# Altium footprint library micro-intel.PCBLIB: 48 footprints (part 1 of 4)
Each footprint in its own frame and in the unit in brackets; x right, y up, seen from the top. Pads: shape width x height; smd on the part's side, far side on the other; paste and mask are expansions set on the pad; w line width, h text height; cw(c..) or ccw(c..) is an arc to the next point about the centre after c.
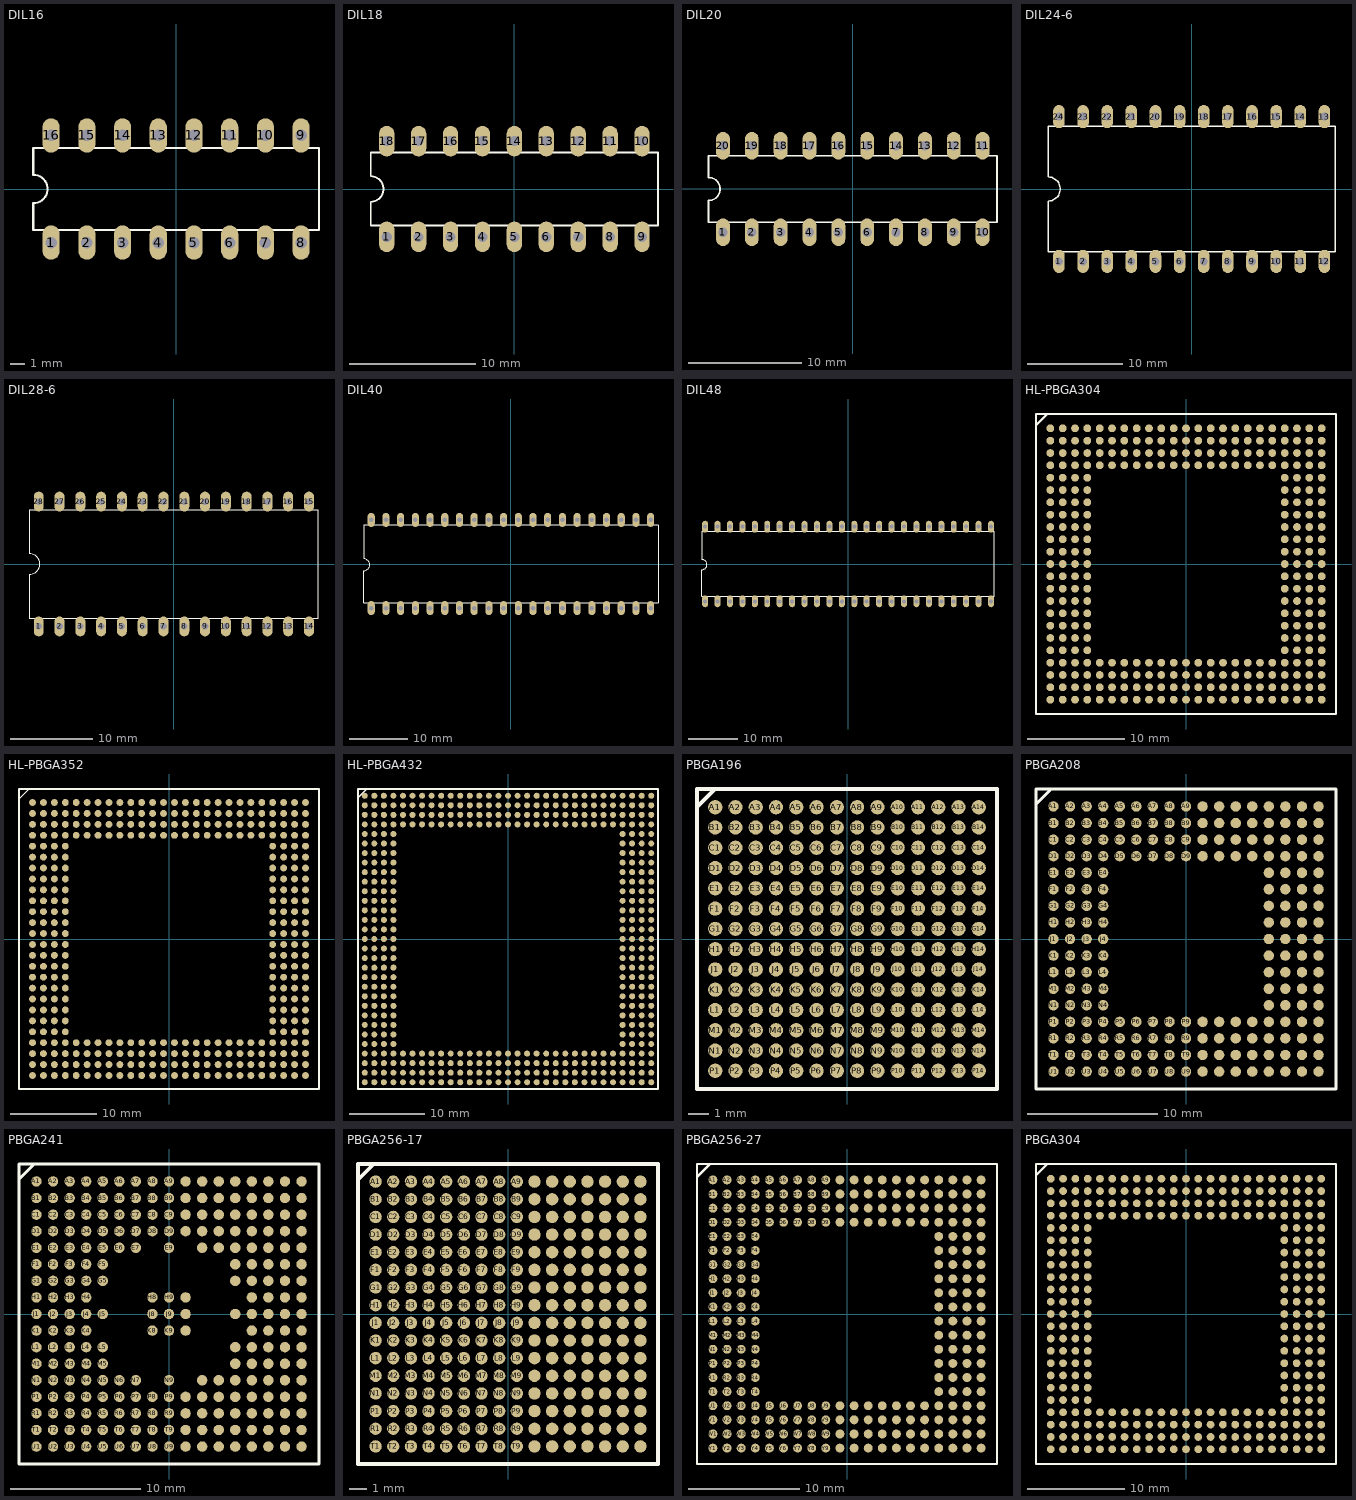
[diagram p0: the footprints below, top view; thin cyan lines are the x and y axes]

## DIL16 [mil]
pads (16):
  oval 48x96 hole 32: 1(-350,-150) 2(-250,-150) 3(-150,-150) 4(-50,-150) 5(50,-150) 6(150,-150) 7(250,-150) 8(350,-150) 9(350,150) 10(250,150) 11(150,150) 12(50,150) 13(-50,150) 14(-150,150) 15(-250,150) 16(-350,150)
Top Overlay:
  lines w6: -400,-115 400,-115 400,115 -400,115 -400,40 cw(c-400,0) -400,-40 -400,-115

## DIL18 [mil]
pads (18):
  oval 48x96 hole 32: 1(-400,-150) 2(-300,-150) 3(-200,-150) 4(-100,-150) 5(0,-150) 6(100,-150) 7(200,-150) 8(300,-150) 9(400,-150) 10(400,150) 11(300,150) 12(200,150) 13(100,150) 14(0,150) 15(-100,150) 16(-200,150) 17(-300,150) 18(-400,150)
Top Overlay:
  lines w6: -450,-115 450,-115 450,115 -450,115 -450,40 cw(c-450,0) -450,-40 -450,-115

## DIL20 [mil]
pads (20):
  oval 48x96 hole 32: 1(-450,-150) 2(-350,-150) 3(-250,-150) 4(-150,-150) 5(-50,-150) 6(50,-150) 7(150,-150) 8(250,-150) 9(350,-150) 10(450,-150) 11(450,150) 12(350,150) 13(250,150) 14(150,150) 15(50,150) 16(-50,150) 17(-150,150) 18(-250,150) 19(-350,150) 20(-450,150)
Top Overlay:
  lines w6: -500,-115 500,-115 500,115 -500,115 -500,40 cw(c-500,0) -500,-40 -500,-115

## DIL24-6 [mil]
pads (24):
  oval 48x96 hole 32: 1(-550,-300) 2(-450,-300) 3(-350,-300) 4(-250,-300) 5(-150,-300) 6(-50,-300) 7(50,-300) 8(150,-300) 9(250,-300) 10(350,-300) 11(450,-300) 12(550,-300) 13(550,300) 14(450,300) 15(350,300) 16(250,300) 17(150,300) 18(50,300) 19(-50,300) 20(-150,300) 21(-250,300) 22(-350,300) 23(-450,300) 24(-550,300)
Top Overlay:
  lines w6: -595,-260 -595,-50 ccw(c-595,0) -595,50 -595,260 595,260 595,-260 -595,-260

## DIL28-6 [mil]
pads (28):
  oval 48x96 hole 32: 1(-650,-300) 2(-550,-300) 3(-450,-300) 4(-350,-300) 5(-250,-300) 6(-150,-300) 7(-50,-300) 8(50,-300) 9(150,-300) 10(250,-300) 11(350,-300) 12(450,-300) 13(550,-300) 14(650,-300) 15(650,300) 16(550,300) 17(450,300) 18(350,300) 19(250,300) 20(150,300) 21(50,300) 22(-50,300) 23(-150,300) 24(-250,300) 25(-350,300) 26(-450,300) 27(-550,300) 28(-650,300)
Top Overlay:
  lines w6: -695,-260 -695,-50 ccw(c-695,0) -695,50 -695,260 695,260 695,-260 -695,-260

## DIL40 [mil]
pads (40):
  oval 48x96 hole 32: 1(-950,-300) 2(-850,-300) 3(-750,-300) 4(-650,-300) 5(-550,-300) 6(-450,-300) 7(-350,-300) 8(-250,-300) 9(-150,-300) 10(-50,-300) 11(50,-300) 12(150,-300) 13(250,-300) 14(350,-300) 15(450,-300) 16(550,-300) 17(650,-300) 18(750,-300) 19(850,-300) 20(950,-300) 21(950,300) 22(850,300) 23(750,300) 24(650,300) 25(550,300) 26(450,300) 27(350,300) 28(250,300) 29(150,300) 30(50,300) 31(-50,300) 32(-150,300) 33(-250,300) 34(-350,300) 35(-450,300) 36(-550,300) 37(-650,300) 38(-750,300) 39(-850,300) 40(-950,300)
Top Overlay:
  lines w6: -1000,-265 1000,-265 1000,265 -1000,265 -1000,35 cw(c-1000,-5) -1000,-45 -1000,-265

## DIL48 [mil]
pads (48):
  oval 48x96 hole 32: 1(-1150,-300) 2(-1050,-300) 3(-950,-300) 4(-850,-300) 5(-750,-300) 6(-650,-300) 7(-550,-300) 8(-450,-300) 9(-350,-300) 10(-250,-300) 11(-150,-300) 12(-50,-300) 13(50,-300) 14(150,-300) 15(250,-300) 16(350,-300) 17(450,-300) 18(550,-300) 19(650,-300) 20(750,-300) 21(850,-300) 22(950,-300) 23(1050,-300) 24(1150,-300) 25(1150,300) 26(1050,300) 27(950,300) 28(850,300) 29(750,300) 30(650,300) 31(550,300) 32(450,300) 33(350,300) 34(250,300) 35(150,300) 36(50,300) 37(-50,300) 38(-150,300) 39(-250,300) 40(-350,300) 41(-450,300) 42(-550,300) 43(-650,300) 44(-750,300) 45(-850,300) 46(-950,300) 47(-1050,300) 48(-1150,300)
Top Overlay:
  lines w6: -1175,-260 1175,-260 1175,260 -1175,260 -1175,35 cw(c-1175,-5) -1175,-45 -1175,-260

## HL-PBGA304 [mil]
pads (304):
  rrect100% 31.5x31.5 smd: A1(-550,550) A2(-500,550) A3(-450,550) A4(-400,550) A5(-350,550) A6(-300,550) A7(-250,550) A8(-200,550) A9(-150,550) A10(-100,550) A11(-50,550) A12(0,550) A13(50,550) A14(100,550) A15(150,550) A16(200,550) A17(250,550) A18(300,550) A19(350,550) A20(400,550) A21(450,550) A22(500,550) A23(550,550) AA1(-550,-450) AA2(-500,-450) AA3(-450,-450) AA4(-400,-450) AA5(-350,-450) AA6(-300,-450) AA7(-250,-450) AA8(-200,-450) AA9(-150,-450) AA10(-100,-450) AA11(-50,-450) AA12(0,-450) AA13(50,-450) AA14(100,-450) AA15(150,-450) AA16(200,-450) AA17(250,-450) AA18(300,-450) AA19(350,-450) AA20(400,-450) AA21(450,-450) AA22(500,-450) AA23(550,-450) AB1(-550,-500) AB2(-500,-500) AB3(-450,-500) AB4(-400,-500) AB5(-350,-500) AB6(-300,-500) AB7(-250,-500) AB8(-200,-500) AB9(-150,-500) AB10(-100,-500) AB11(-50,-500) AB12(0,-500) AB13(50,-500) AB14(100,-500) AB15(150,-500) AB16(200,-500) AB17(250,-500) AB18(300,-500) AB19(350,-500) AB20(400,-500) AB21(450,-500) AB22(500,-500) AB23(550,-500) AC1(-550,-550) AC2(-500,-550) AC3(-450,-550) AC4(-400,-550) AC5(-350,-550) AC6(-300,-550) AC7(-250,-550) AC8(-200,-550) AC9(-150,-550) AC10(-100,-550) AC11(-50,-550) AC12(0,-550) AC13(50,-550) AC14(100,-550) AC15(150,-550) AC16(200,-550) AC17(250,-550) AC18(300,-550) AC19(350,-550) AC20(400,-550) AC21(450,-550) AC22(500,-550) AC23(550,-550) B1(-550,500) B2(-500,500) B3(-450,500) B4(-400,500) B5(-350,500) B6(-300,500) B7(-250,500) B8(-200,500) B9(-150,500) B10(-100,500) B11(-50,500) B12(0,500) B13(50,500) B14(100,500) B15(150,500) B16(200,500) B17(250,500) B18(300,500) B19(350,500) B20(400,500) B21(450,500) B22(500,500) B23(550,500) C1(-550,450) C2(-500,450) C3(-450,450) C4(-400,450) C5(-350,450) C6(-300,450) C7(-250,450) C8(-200,450) C9(-150,450) C10(-100,450) C11(-50,450) C12(0,450) C13(50,450) C14(100,450) C15(150,450) C16(200,450) C17(250,450) C18(300,450) C19(350,450) C20(400,450) C21(450,450) C22(500,450) C23(550,450) D1(-550,400) D2(-500,400) D3(-450,400) D4(-400,400) D5(-350,400) D6(-300,400) D7(-250,400) D8(-200,400) D9(-150,400) D10(-100,400) D11(-50,400) D12(0,400) D13(50,400) D14(100,400) D15(150,400) D16(200,400) D17(250,400) D18(300,400) D19(350,400) D20(400,400) D21(450,400) D22(500,400) D23(550,400) E1(-550,350) E2(-500,350) E3(-450,350) E4(-400,350) E20(400,350) E21(450,350) E22(500,350) E23(550,350) F1(-550,300) F2(-500,300) F3(-450,300) F4(-400,300) F20(400,300) F21(450,300) F22(500,300) F23(550,300) G1(-550,250) G2(-500,250) G3(-450,250) G4(-400,250) G20(400,250) G21(450,250) G22(500,250) G23(550,250) H1(-550,200) H2(-500,200) H3(-450,200) H4(-400,200) H20(400,200) H21(450,200) H22(500,200) H23(550,200) J1(-550,150) J2(-500,150) J3(-450,150) J4(-400,150) J20(400,150) J21(450,150) J22(500,150) J23(550,150) K1(-550,100) K2(-500,100) K3(-450,100) K4(-400,100) K20(400,100) K21(450,100) K22(500,100) K23(550,100) L1(-550,50) L2(-500,50) L3(-450,50) L4(-400,50) L20(400,50) L21(450,50) L22(500,50) L23(550,50) M1(-550,0) M2(-500,0) M3(-450,0) M4(-400,0) M20(400,0) M21(450,0) M22(500,0) M23(550,0) N1(-550,-50) N2(-500,-50) N3(-450,-50) N4(-400,-50) N20(400,-50) N21(450,-50) N22(500,-50) N23(550,-50) P1(-550,-100) P2(-500,-100) P3(-450,-100) P4(-400,-100) P20(400,-100) P21(450,-100) P22(500,-100) P23(550,-100) R1(-550,-150) R2(-500,-150) R3(-450,-150) R4(-400,-150) R20(400,-150) R21(450,-150) R22(500,-150) R23(550,-150) T1(-550,-200) T2(-500,-200) T3(-450,-200) T4(-400,-200) T20(400,-200) T21(450,-200) T22(500,-200) T23(550,-200) U1(-550,-250) U2(-500,-250) U3(-450,-250) U4(-400,-250) U20(400,-250) U21(450,-250) U22(500,-250) U23(550,-250) V1(-550,-300) V2(-500,-300) V3(-450,-300) V4(-400,-300) V20(400,-300) V21(450,-300) V22(500,-300) V23(550,-300) W1(-550,-350) W2(-500,-350) W3(-450,-350) W4(-400,-350) W20(400,-350) W21(450,-350) W22(500,-350) W23(550,-350) Y1(-550,-400) Y2(-500,-400) Y3(-450,-400) Y4(-400,-400) Y5(-350,-400) Y6(-300,-400) Y7(-250,-400) Y8(-200,-400) Y9(-150,-400) Y10(-100,-400) Y11(-50,-400) Y12(0,-400) Y13(50,-400) Y14(100,-400) Y15(150,-400) Y16(200,-400) Y17(250,-400) Y18(300,-400) Y19(350,-400) Y20(400,-400) Y21(450,-400) Y22(500,-400) Y23(550,-400)
Top Overlay:
  lines w8: -608.2,562.2 -608.2,608.2 -562.2,608.2 ; -608.2,562.2 -608.2,-608.2 608.2,-608.2 608.2,608.2 -562.2,608.2 ; -608.2,562.2 -562.2,608.2
Top Solder:
  drawing of 304 lines, arcs and shapes, not listed

## HL-PBGA352 [mil]
pads (352):
  rrect100% 31.5x31.5 smd: A1(-625,625) A2(-575,625) A3(-525,625) A4(-475,625) A5(-425,625) A6(-375,625) A7(-325,625) A8(-275,625) A9(-225,625) A10(-175,625) A11(-125,625) A12(-75,625) A13(-25,625) A14(25,625) A15(75,625) A16(125,625) A17(175,625) A18(225,625) A19(275,625) A20(325,625) A21(375,625) A22(425,625) A23(475,625) A24(525,625) A25(575,625) A26(625,625) AA1(-625,-375) AA2(-575,-375) AA3(-525,-375) AA4(-475,-375) AA23(475,-375) AA24(525,-375) AA25(575,-375) AA26(625,-375) AB1(-625,-425) AB2(-575,-425) AB3(-525,-425) AB4(-475,-425) AB23(475,-425) AB24(525,-425) AB25(575,-425) AB26(625,-425) AC1(-625,-475) AC2(-575,-475) AC3(-525,-475) AC4(-475,-475) AC5(-425,-475) AC6(-375,-475) AC7(-325,-475) AC8(-275,-475) AC9(-225,-475) AC10(-175,-475) AC11(-125,-475) AC12(-75,-475) AC13(-25,-475) AC14(25,-475) AC15(75,-475) AC16(125,-475) AC17(175,-475) AC18(225,-475) AC19(275,-475) AC20(325,-475) AC21(375,-475) AC22(425,-475) AC23(475,-475) AC24(525,-475) AC25(575,-475) AC26(625,-475) AD1(-625,-525) AD2(-575,-525) AD3(-525,-525) AD4(-475,-525) AD5(-425,-525) AD6(-375,-525) AD7(-325,-525) AD8(-275,-525) AD9(-225,-525) AD10(-175,-525) AD11(-125,-525) AD12(-75,-525) AD13(-25,-525) AD14(25,-525) AD15(75,-525) AD16(125,-525) AD17(175,-525) AD18(225,-525) AD19(275,-525) AD20(325,-525) AD21(375,-525) AD22(425,-525) AD23(475,-525) AD24(525,-525) AD25(575,-525) AD26(625,-525) AE1(-625,-575) AE2(-575,-575) AE3(-525,-575) AE4(-475,-575) AE5(-425,-575) AE6(-375,-575) AE7(-325,-575) AE8(-275,-575) AE9(-225,-575) AE10(-175,-575) AE11(-125,-575) AE12(-75,-575) AE13(-25,-575) AE14(25,-575) AE15(75,-575) AE16(125,-575) AE17(175,-575) AE18(225,-575) AE19(275,-575) AE20(325,-575) AE21(375,-575) AE22(425,-575) AE23(475,-575) AE24(525,-575) AE25(575,-575) AE26(625,-575) AF1(-625,-625) AF2(-575,-625) AF3(-525,-625) AF4(-475,-625) AF5(-425,-625) AF6(-375,-625) AF7(-325,-625) AF8(-275,-625) AF9(-225,-625) AF10(-175,-625) AF11(-125,-625) AF12(-75,-625) AF13(-25,-625) AF14(25,-625) AF15(75,-625) AF16(125,-625) AF17(175,-625) AF18(225,-625) AF19(275,-625) AF20(325,-625) AF21(375,-625) AF22(425,-625) AF23(475,-625) AF24(525,-625) AF25(575,-625) AF26(625,-625) B1(-625,575) B2(-575,575) B3(-525,575) B4(-475,575) B5(-425,575) B6(-375,575) B7(-325,575) B8(-275,575) B9(-225,575) B10(-175,575) B11(-125,575) B12(-75,575) B13(-25,575) B14(25,575) B15(75,575) B16(125,575) B17(175,575) B18(225,575) B19(275,575) B20(325,575) B21(375,575) B22(425,575) B23(475,575) B24(525,575) B25(575,575) B26(625,575) C1(-625,525) C2(-575,525) C3(-525,525) C4(-475,525) C5(-425,525) C6(-375,525) C7(-325,525) C8(-275,525) C9(-225,525) C10(-175,525) C11(-125,525) C12(-75,525) C13(-25,525) C14(25,525) C15(75,525) C16(125,525) C17(175,525) C18(225,525) C19(275,525) C20(325,525) C21(375,525) C22(425,525) C23(475,525) C24(525,525) C25(575,525) C26(625,525) D1(-625,475) D2(-575,475) D3(-525,475) D4(-475,475) D5(-425,475) D6(-375,475) D7(-325,475) D8(-275,475) D9(-225,475) D10(-175,475) D11(-125,475) D12(-75,475) D13(-25,475) D14(25,475) D15(75,475) D16(125,475) D17(175,475) D18(225,475) D19(275,475) D20(325,475) D21(375,475) D22(425,475) D23(475,475) D24(525,475) D25(575,475) D26(625,475) E1(-625,425) E2(-575,425) E3(-525,425) E4(-475,425) E23(475,425) E24(525,425) E25(575,425) E26(625,425) F1(-625,375) F2(-575,375) F3(-525,375) F4(-475,375) F23(475,375) F24(525,375) F25(575,375) F26(625,375) G1(-625,325) G2(-575,325) G3(-525,325) G4(-475,325) G23(475,325) G24(525,325) G25(575,325) G26(625,325) H1(-625,275) H2(-575,275) H3(-525,275) H4(-475,275) H23(475,275) H24(525,275) H25(575,275) H26(625,275) J1(-625,225) J2(-575,225) J3(-525,225) J4(-475,225) J23(475,225) J24(525,225) J25(575,225) J26(625,225) K1(-625,175) K2(-575,175) K3(-525,175) K4(-475,175) K23(475,175) K24(525,175) K25(575,175) K26(625,175) L1(-625,125) L2(-575,125) L3(-525,125) L4(-475,125) L23(475,125) L24(525,125) L25(575,125) L26(625,125) M1(-625,75) M2(-575,75) M3(-525,75) M4(-475,75) M23(475,75) M24(525,75) M25(575,75) M26(625,75) N1(-625,25) N2(-575,25) N3(-525,25) N4(-475,25) N23(475,25) N24(525,25) N25(575,25) N26(625,25) P1(-625,-25) P2(-575,-25) P3(-525,-25) P4(-475,-25) P23(475,-25) P24(525,-25) P25(575,-25) P26(625,-25) R1(-625,-75) R2(-575,-75) R3(-525,-75) R4(-475,-75) R23(475,-75) R24(525,-75) R25(575,-75) R26(625,-75) T1(-625,-125) T2(-575,-125) T3(-525,-125) T4(-475,-125) T23(475,-125) T24(525,-125) T25(575,-125) T26(625,-125) U1(-625,-175) U2(-575,-175) U3(-525,-175) U4(-475,-175) U23(475,-175) U24(525,-175) U25(575,-175) U26(625,-175) V1(-625,-225) V2(-575,-225) V3(-525,-225) V4(-475,-225) V23(475,-225) V24(525,-225) V25(575,-225) V26(625,-225) W1(-625,-275) W2(-575,-275) W3(-525,-275) W4(-475,-275) W23(475,-275) W24(525,-275) W25(575,-275) W26(625,-275) Y1(-625,-325) Y2(-575,-325) Y3(-525,-325) Y4(-475,-325) Y23(475,-325) Y24(525,-325) Y25(575,-325) Y26(625,-325)
Top Overlay:
  lines w8: -686.94,640.94 -686.94,686.94 -640.94,686.94 ; -686.94,640.94 -686.94,-686.94 686.94,-686.94 686.94,686.94 -640.94,686.94 ; -686.94,640.94 -640.94,686.94
Top Solder:
  drawing of 352 lines, arcs and shapes, not listed

## HL-PBGA432 [mil]
pads (432):
  rrect100% 31.5x31.5 smd: A1(-750,750) A2(-700,750) A3(-650,750) A4(-600,750) A5(-550,750) A6(-500,750) A7(-450,750) A8(-400,750) A9(-350,750) A10(-300,750) A11(-250,750) A12(-200,750) A13(-150,750) A14(-100,750) A15(-50,750) A16(0,750) A17(50,750) A18(100,750) A19(150,750) A20(200,750) A21(250,750) A22(300,750) A23(350,750) A24(400,750) A25(450,750) A26(500,750) A27(550,750) A28(600,750) A29(650,750) A30(700,750) A31(750,750) AA1(-750,-250) AA2(-700,-250) AA3(-650,-250) AA4(-600,-250) AA28(600,-250) AA29(650,-250) AA30(700,-250) AA31(750,-250) AB1(-750,-300) AB2(-700,-300) AB3(-650,-300) AB4(-600,-300) AB28(600,-300) AB29(650,-300) AB30(700,-300) AB31(750,-300) AC1(-750,-350) AC2(-700,-350) AC3(-650,-350) AC4(-600,-350) AC28(600,-350) AC29(650,-350) AC30(700,-350) AC31(750,-350) AD1(-750,-400) AD2(-700,-400) AD3(-650,-400) AD4(-600,-400) AD28(600,-400) AD29(650,-400) AD30(700,-400) AD31(750,-400) AE1(-750,-450) AE2(-700,-450) AE3(-650,-450) AE4(-600,-450) AE28(600,-450) AE29(650,-450) AE30(700,-450) AE31(750,-450) AF1(-750,-500) AF2(-700,-500) AF3(-650,-500) AF4(-600,-500) AF28(600,-500) AF29(650,-500) AF30(700,-500) AF31(750,-500) AG1(-750,-550) AG2(-700,-550) AG3(-650,-550) AG4(-600,-550) AG28(600,-550) AG29(650,-550) AG30(700,-550) AG31(750,-550) AH1(-750,-600) AH2(-700,-600) AH3(-650,-600) AH4(-600,-600) AH5(-550,-600) AH6(-500,-600) AH7(-450,-600) AH8(-400,-600) AH9(-350,-600) AH10(-300,-600) AH11(-250,-600) AH12(-200,-600) AH13(-150,-600) AH14(-100,-600) AH15(-50,-600) AH16(0,-600) AH17(50,-600) AH18(100,-600) AH19(150,-600) AH20(200,-600) AH21(250,-600) AH22(300,-600) AH23(350,-600) AH24(400,-600) AH25(450,-600) AH26(500,-600) AH27(550,-600) AH28(600,-600) AH29(650,-600) AH30(700,-600) AH31(750,-600) AJ1(-750,-650) AJ2(-700,-650) AJ3(-650,-650) AJ4(-600,-650) AJ5(-550,-650) AJ6(-500,-650) AJ7(-450,-650) AJ8(-400,-650) AJ9(-350,-650) AJ10(-300,-650) AJ11(-250,-650) AJ12(-200,-650) AJ13(-150,-650) AJ14(-100,-650) AJ15(-50,-650) AJ16(0,-650) AJ17(50,-650) AJ18(100,-650) AJ19(150,-650) AJ20(200,-650) AJ21(250,-650) AJ22(300,-650) AJ23(350,-650) AJ24(400,-650) AJ25(450,-650) AJ26(500,-650) AJ27(550,-650) AJ28(600,-650) AJ29(650,-650) AJ30(700,-650) AJ31(750,-650) AK1(-750,-700) AK2(-700,-700) AK3(-650,-700) AK4(-600,-700) AK5(-550,-700) AK6(-500,-700) AK7(-450,-700) AK8(-400,-700) AK9(-350,-700) AK10(-300,-700) AK11(-250,-700) AK12(-200,-700) AK13(-150,-700) AK14(-100,-700) AK15(-50,-700) AK16(0,-700) AK17(50,-700) AK18(100,-700) AK19(150,-700) AK20(200,-700) AK21(250,-700) AK22(300,-700) AK23(350,-700) AK24(400,-700) AK25(450,-700) AK26(500,-700) AK27(550,-700) AK28(600,-700) AK29(650,-700) AK30(700,-700) AK31(750,-700) AL1(-750,-750) AL2(-700,-750) AL3(-650,-750) AL4(-600,-750) AL5(-550,-750) AL6(-500,-750) AL7(-450,-750) AL8(-400,-750) AL9(-350,-750) AL10(-300,-750) AL11(-250,-750) AL12(-200,-750) AL13(-150,-750) AL14(-100,-750) AL15(-50,-750) AL16(0,-750) AL17(50,-750) AL18(100,-750) AL19(150,-750) AL20(200,-750) AL21(250,-750) AL22(300,-750) AL23(350,-750) AL24(400,-750) AL25(450,-750) AL26(500,-750) AL27(550,-750) AL28(600,-750) AL29(650,-750) AL30(700,-750) AL31(750,-750) B1(-750,700) B2(-700,700) B3(-650,700) B4(-600,700) B5(-550,700) B6(-500,700) B7(-450,700) B8(-400,700) B9(-350,700) B10(-300,700) B11(-250,700) B12(-200,700) B13(-150,700) B14(-100,700) B15(-50,700) B16(0,700) B17(50,700) B18(100,700) B19(150,700) B20(200,700) B21(250,700) B22(300,700) B23(350,700) B24(400,700) B25(450,700) B26(500,700) B27(550,700) B28(600,700) B29(650,700) B30(700,700) B31(750,700) C1(-750,650) C2(-700,650) C3(-650,650) C4(-600,650) C5(-550,650) C6(-500,650) C7(-450,650) C8(-400,650) C9(-350,650) C10(-300,650) C11(-250,650) C12(-200,650) C13(-150,650) C14(-100,650) C15(-50,650) C16(0,650) C17(50,650) C18(100,650) C19(150,650) C20(200,650) C21(250,650) C22(300,650) C23(350,650) C24(400,650) C25(450,650) C26(500,650) C27(550,650) C28(600,650) C29(650,650) C30(700,650) C31(750,650) D1(-750,600) D2(-700,600) D3(-650,600) D4(-600,600) D5(-550,600) D6(-500,600) D7(-450,600) D8(-400,600) D9(-350,600) D10(-300,600) D11(-250,600) D12(-200,600) D13(-150,600) D14(-100,600) D15(-50,600) D16(0,600) D17(50,600) D18(100,600) D19(150,600) D20(200,600) D21(250,600) D22(300,600) D23(350,600) D24(400,600) D25(450,600) D26(500,600) D27(550,600) D28(600,600) D29(650,600) D30(700,600) D31(750,600) E1(-750,550) E2(-700,550) E3(-650,550) E4(-600,550) E28(600,550) E29(650,550) E30(700,550) E31(750,550) F1(-750,500) F2(-700,500) F3(-650,500) F4(-600,500) F28(600,500) F29(650,500) F30(700,500) F31(750,500) G1(-750,450) G2(-700,450) G3(-650,450) G4(-600,450) G28(600,450) G29(650,450) G30(700,450) G31(750,450) H1(-750,400) H2(-700,400) H3(-650,400) H4(-600,400) H28(600,400) H29(650,400) H30(700,400) H31(750,400) J1(-750,350) J2(-700,350) J3(-650,350) J4(-600,350) J28(600,350) J29(650,350) J30(700,350) J31(750,350) K1(-750,300) K2(-700,300) K3(-650,300) K4(-600,300) K28(600,300) K29(650,300) K30(700,300) K31(750,300) L1(-750,250) L2(-700,250) L3(-650,250) L4(-600,250) L28(600,250) L29(650,250) L30(700,250) L31(750,250) M1(-750,200) M2(-700,200) M3(-650,200) M4(-600,200) M28(600,200) M29(650,200) M30(700,200) M31(750,200) N1(-750,150) N2(-700,150) N3(-650,150) N4(-600,150) N28(600,150) N29(650,150) N30(700,150) N31(750,150) P1(-750,100) P2(-700,100) P3(-650,100) P4(-600,100) P28(600,100) P29(650,100) P30(700,100) P31(750,100) R1(-750,50) R2(-700,50) R3(-650,50) R4(-600,50) R28(600,50) R29(650,50) R30(700,50) R31(750,50) T1(-750,0) T2(-700,0) T3(-650,0) T4(-600,0) T28(600,0) T29(650,0) T30(700,0) T31(750,0) U1(-750,-50) U2(-700,-50) U3(-650,-50) U4(-600,-50) U28(600,-50) U29(650,-50) U30(700,-50) U31(750,-50) V1(-750,-100) V2(-700,-100) V3(-650,-100) V4(-600,-100) V28(600,-100) V29(650,-100) V30(700,-100) V31(750,-100) W1(-750,-150) W2(-700,-150) W3(-650,-150) W4(-600,-150) W28(600,-150) W29(650,-150) W30(700,-150) W31(750,-150) Y1(-750,-200) Y2(-700,-200) Y3(-650,-200) Y4(-600,-200) Y28(600,-200) Y29(650,-200) Y30(700,-200) Y31(750,-200)
Top Overlay:
  lines w8: -785.37,739.37 -785.37,785.37 -739.37,785.37 ; -785.37,739.37 -785.37,-785.37 785.37,-785.37 785.37,785.37 -739.37,785.37 ; -785.37,739.37 -739.37,785.37
Top Solder:
  drawing of 432 lines, arcs and shapes, not listed

## PBGA196 [mil]
pads (196):
  rrect100% 27.56x27.56 smd: A1(-255.91,255.91) A2(-216.54,255.91) A3(-177.17,255.91) A4(-137.8,255.91) A5(-98.43,255.91) A6(-59.06,255.91) A7(-19.69,255.91) A8(19.69,255.91) A9(59.06,255.91) A10(98.43,255.91) A11(137.8,255.91) A12(177.17,255.91) A13(216.54,255.91) A14(255.91,255.91) B1(-255.91,216.54) B2(-216.54,216.54) B3(-177.17,216.54) B4(-137.8,216.54) B5(-98.43,216.54) B6(-59.06,216.54) B7(-19.69,216.54) B8(19.69,216.54) B9(59.06,216.54) B10(98.43,216.54) B11(137.8,216.54) B12(177.17,216.54) B13(216.54,216.54) B14(255.91,216.54) C1(-255.91,177.17) C2(-216.54,177.17) C3(-177.17,177.17) C4(-137.8,177.17) C5(-98.43,177.17) C6(-59.06,177.17) C7(-19.69,177.17) C8(19.69,177.17) C9(59.06,177.17) C10(98.43,177.17) C11(137.8,177.17) C12(177.17,177.17) C13(216.54,177.17) C14(255.91,177.17) D1(-255.91,137.8) D2(-216.54,137.8) D3(-177.17,137.8) D4(-137.8,137.8) D5(-98.43,137.8) D6(-59.06,137.8) D7(-19.69,137.8) D8(19.69,137.8) D9(59.06,137.8) D10(98.43,137.8) D11(137.8,137.8) D12(177.17,137.8) D13(216.54,137.8) D14(255.91,137.8) E1(-255.91,98.43) E2(-216.54,98.43) E3(-177.17,98.43) E4(-137.8,98.43) E5(-98.43,98.43) E6(-59.06,98.43) E7(-19.69,98.43) E8(19.69,98.43) E9(59.06,98.43) E10(98.43,98.43) E11(137.8,98.43) E12(177.17,98.43) E13(216.54,98.43) E14(255.91,98.43) F1(-255.91,59.06) F2(-216.54,59.06) F3(-177.17,59.06) F4(-137.8,59.06) F5(-98.43,59.06) F6(-59.06,59.06) F7(-19.69,59.06) F8(19.69,59.06) F9(59.06,59.06) F10(98.43,59.06) F11(137.8,59.06) F12(177.17,59.06) F13(216.54,59.06) F14(255.91,59.06) G1(-255.91,19.69) G2(-216.54,19.69) G3(-177.17,19.69) G4(-137.8,19.69) G5(-98.43,19.69) G6(-59.06,19.69) G7(-19.69,19.69) G8(19.69,19.69) G9(59.06,19.69) G10(98.43,19.69) G11(137.8,19.69) G12(177.17,19.69) G13(216.54,19.69) G14(255.91,19.69) H1(-255.91,-19.69) H2(-216.54,-19.69) H3(-177.17,-19.69) H4(-137.8,-19.69) H5(-98.43,-19.69) H6(-59.06,-19.69) H7(-19.69,-19.69) H8(19.69,-19.69) H9(59.06,-19.69) H10(98.43,-19.69) H11(137.8,-19.69) H12(177.17,-19.69) H13(216.54,-19.69) H14(255.91,-19.69) J1(-255.91,-59.06) J2(-216.54,-59.06) J3(-177.17,-59.06) J4(-137.8,-59.06) J5(-98.43,-59.06) J6(-59.06,-59.06) J7(-19.69,-59.06) J8(19.69,-59.06) J9(59.06,-59.06) J10(98.43,-59.06) J11(137.8,-59.06) J12(177.17,-59.06) J13(216.54,-59.06) J14(255.91,-59.06) K1(-255.91,-98.43) K2(-216.54,-98.43) K3(-177.17,-98.43) K4(-137.8,-98.43) K5(-98.43,-98.43) K6(-59.06,-98.43) K7(-19.69,-98.43) K8(19.69,-98.43) K9(59.06,-98.43) K10(98.43,-98.43) K11(137.8,-98.43) K12(177.17,-98.43) K13(216.54,-98.43) K14(255.91,-98.43) L1(-255.91,-137.8) L2(-216.54,-137.8) L3(-177.17,-137.8) L4(-137.8,-137.8) L5(-98.43,-137.8) L6(-59.06,-137.8) L7(-19.69,-137.8) L8(19.69,-137.8) L9(59.06,-137.8) L10(98.43,-137.8) L11(137.8,-137.8) L12(177.17,-137.8) L13(216.54,-137.8) L14(255.91,-137.8) M1(-255.91,-177.17) M2(-216.54,-177.17) M3(-177.17,-177.17) M4(-137.8,-177.17) M5(-98.43,-177.17) M6(-59.06,-177.17) M7(-19.69,-177.17) M8(19.69,-177.17) M9(59.06,-177.17) M10(98.43,-177.17) M11(137.8,-177.17) M12(177.17,-177.17) M13(216.54,-177.17) M14(255.91,-177.17) N1(-255.91,-216.54) N2(-216.54,-216.54) N3(-177.17,-216.54) N4(-137.8,-216.54) N5(-98.43,-216.54) N6(-59.06,-216.54) N7(-19.69,-216.54) N8(19.69,-216.54) N9(59.06,-216.54) N10(98.43,-216.54) N11(137.8,-216.54) N12(177.17,-216.54) N13(216.54,-216.54) N14(255.91,-216.54) P1(-255.91,-255.91) P2(-216.54,-255.91) P3(-177.17,-255.91) P4(-137.8,-255.91) P5(-98.43,-255.91) P6(-59.06,-255.91) P7(-19.69,-255.91) P8(19.69,-255.91) P9(59.06,-255.91) P10(98.43,-255.91) P11(137.8,-255.91) P12(177.17,-255.91) P13(216.54,-255.91) P14(255.91,-255.91)
Top Overlay:
  lines w8: -291.28,255.91 -291.28,291.28 -255.91,291.28 ; -291.28,255.91 -291.28,-291.28 291.28,-291.28 291.28,291.28 -255.91,291.28 ; -291.28,255.91 -255.91,291.28
Top Solder:
  drawing of 196 lines, arcs and shapes, not listed

## PBGA208 [mil]
pads (208):
  rrect100% 31.5x31.5 smd: A1(-400,400) A2(-350,400) A3(-300,400) A4(-250,400) A5(-200,400) A6(-150,400) A7(-100,400) A8(-50,400) A9(0,400) A10(50,400) A11(100,400) A12(150,400) A13(200,400) A14(250,400) A15(300,400) A16(350,400) A17(400,400) B1(-400,350) B2(-350,350) B3(-300,350) B4(-250,350) B5(-200,350) B6(-150,350) B7(-100,350) B8(-50,350) B9(0,350) B10(50,350) B11(100,350) B12(150,350) B13(200,350) B14(250,350) B15(300,350) B16(350,350) B17(400,350) C1(-400,300) C2(-350,300) C3(-300,300) C4(-250,300) C5(-200,300) C6(-150,300) C7(-100,300) C8(-50,300) C9(0,300) C10(50,300) C11(100,300) C12(150,300) C13(200,300) C14(250,300) C15(300,300) C16(350,300) C17(400,300) D1(-400,250) D2(-350,250) D3(-300,250) D4(-250,250) D5(-200,250) D6(-150,250) D7(-100,250) D8(-50,250) D9(0,250) D10(50,250) D11(100,250) D12(150,250) D13(200,250) D14(250,250) D15(300,250) D16(350,250) D17(400,250) E1(-400,200) E2(-350,200) E3(-300,200) E4(-250,200) E14(250,200) E15(300,200) E16(350,200) E17(400,200) F1(-400,150) F2(-350,150) F3(-300,150) F4(-250,150) F14(250,150) F15(300,150) F16(350,150) F17(400,150) G1(-400,100) G2(-350,100) G3(-300,100) G4(-250,100) G14(250,100) G15(300,100) G16(350,100) G17(400,100) H1(-400,50) H2(-350,50) H3(-300,50) H4(-250,50) H14(250,50) H15(300,50) H16(350,50) H17(400,50) J1(-400,0) J2(-350,0) J3(-300,0) J4(-250,0) J14(250,0) J15(300,0) J16(350,0) J17(400,0) K1(-400,-50) K2(-350,-50) K3(-300,-50) K4(-250,-50) K14(250,-50) K15(300,-50) K16(350,-50) K17(400,-50) L1(-400,-100) L2(-350,-100) L3(-300,-100) L4(-250,-100) L14(250,-100) L15(300,-100) L16(350,-100) L17(400,-100) M1(-400,-150) M2(-350,-150) M3(-300,-150) M4(-250,-150) M14(250,-150) M15(300,-150) M16(350,-150) M17(400,-150) N1(-400,-200) N2(-350,-200) N3(-300,-200) N4(-250,-200) N14(250,-200) N15(300,-200) N16(350,-200) N17(400,-200) P1(-400,-250) P2(-350,-250) P3(-300,-250) P4(-250,-250) P5(-200,-250) P6(-150,-250) P7(-100,-250) P8(-50,-250) P9(0,-250) P10(50,-250) P11(100,-250) P12(150,-250) P13(200,-250) P14(250,-250) P15(300,-250) P16(350,-250) P17(400,-250) R1(-400,-300) R2(-350,-300) R3(-300,-300) R4(-250,-300) R5(-200,-300) R6(-150,-300) R7(-100,-300) R8(-50,-300) R9(0,-300) R10(50,-300) R11(100,-300) R12(150,-300) R13(200,-300) R14(250,-300) R15(300,-300) R16(350,-300) R17(400,-300) T1(-400,-350) T2(-350,-350) T3(-300,-350) T4(-250,-350) T5(-200,-350) T6(-150,-350) T7(-100,-350) T8(-50,-350) T9(0,-350) T10(50,-350) T11(100,-350) T12(150,-350) T13(200,-350) T14(250,-350) T15(300,-350) T16(350,-350) T17(400,-350) U1(-400,-400) U2(-350,-400) U3(-300,-400) U4(-250,-400) U5(-200,-400) U6(-150,-400) U7(-100,-400) U8(-50,-400) U9(0,-400) U10(50,-400) U11(100,-400) U12(150,-400) U13(200,-400) U14(250,-400) U15(300,-400) U16(350,-400) U17(400,-400)
Top Overlay:
  lines w8: -452.69,406.69 -452.69,452.69 -406.69,452.69 ; -452.69,406.69 -452.69,-452.69 452.69,-452.69 452.69,452.69 -406.69,452.69 ; -452.69,406.69 -406.69,452.69
Top Solder:
  drawing of 208 lines, arcs and shapes, not listed

## PBGA241 [mil]
pads (241):
  rrect100% 31.5x31.5 smd: A1(-400,400) A2(-350,400) A3(-300,400) A4(-250,400) A5(-200,400) A6(-150,400) A7(-100,400) A8(-50,400) A9(0,400) A10(50,400) A11(100,400) A12(150,400) A13(200,400) A14(250,400) A15(300,400) A16(350,400) A17(400,400) B1(-400,350) B2(-350,350) B3(-300,350) B4(-250,350) B5(-200,350) B6(-150,350) B7(-100,350) B8(-50,350) B9(0,350) B10(50,350) B11(100,350) B12(150,350) B13(200,350) B14(250,350) B15(300,350) B16(350,350) B17(400,350) C1(-400,300) C2(-350,300) C3(-300,300) C4(-250,300) C5(-200,300) C6(-150,300) C7(-100,300) C8(-50,300) C9(0,300) C10(50,300) C11(100,300) C12(150,300) C13(200,300) C14(250,300) C15(300,300) C16(350,300) C17(400,300) D1(-400,250) D2(-350,250) D3(-300,250) D4(-250,250) D5(-200,250) D6(-150,250) D7(-100,250) D8(-50,250) D9(0,250) D10(50,250) D11(100,250) D12(150,250) D13(200,250) D14(250,250) D15(300,250) D16(350,250) D17(400,250) E1(-400,200) E2(-350,200) E3(-300,200) E4(-250,200) E5(-200,200) E6(-150,200) E7(-100,200) E9(0,200) E11(100,200) E12(150,200) E13(200,200) E14(250,200) E15(300,200) E16(350,200) E17(400,200) F1(-400,150) F2(-350,150) F3(-300,150) F4(-250,150) F5(-200,150) F13(200,150) F14(250,150) F15(300,150) F16(350,150) F17(400,150) G1(-400,100) G2(-350,100) G3(-300,100) G4(-250,100) G5(-200,100) G13(200,100) G14(250,100) G15(300,100) G16(350,100) G17(400,100) H1(-400,50) H2(-350,50) H3(-300,50) H4(-250,50) H8(-50,50) H9(0,50) H10(50,50) H14(250,50) H15(300,50) H16(350,50) H17(400,50) J1(-400,0) J2(-350,0) J3(-300,0) J4(-250,0) J5(-200,0) J8(-50,0) J9(0,0) J10(50,0) J13(200,0) J14(250,0) J15(300,0) J16(350,0) J17(400,0) K1(-400,-50) K2(-350,-50) K3(-300,-50) K4(-250,-50) K8(-50,-50) K9(0,-50) K10(50,-50) K14(250,-50) K15(300,-50) K16(350,-50) K17(400,-50) L1(-400,-100) L2(-350,-100) L3(-300,-100) L4(-250,-100) L5(-200,-100) L13(200,-100) L14(250,-100) L15(300,-100) L16(350,-100) L17(400,-100) M1(-400,-150) M2(-350,-150) M3(-300,-150) M4(-250,-150) M5(-200,-150) M13(200,-150) M14(250,-150) M15(300,-150) M16(350,-150) M17(400,-150) N1(-400,-200) N2(-350,-200) N3(-300,-200) N4(-250,-200) N5(-200,-200) N6(-150,-200) N7(-100,-200) N9(0,-200) N11(100,-200) N12(150,-200) N13(200,-200) N14(250,-200) N15(300,-200) N16(350,-200) N17(400,-200) P1(-400,-250) P2(-350,-250) P3(-300,-250) P4(-250,-250) P5(-200,-250) P6(-150,-250) P7(-100,-250) P8(-50,-250) P9(0,-250) P10(50,-250) P11(100,-250) P12(150,-250) P13(200,-250) P14(250,-250) P15(300,-250) P16(350,-250) P17(400,-250) R1(-400,-300) R2(-350,-300) R3(-300,-300) R4(-250,-300) R5(-200,-300) R6(-150,-300) R7(-100,-300) R8(-50,-300) R9(0,-300) R10(50,-300) R11(100,-300) R12(150,-300) R13(200,-300) R14(250,-300) R15(300,-300) R16(350,-300) R17(400,-300) T1(-400,-350) T2(-350,-350) T3(-300,-350) T4(-250,-350) T5(-200,-350) T6(-150,-350) T7(-100,-350) T8(-50,-350) T9(0,-350) T10(50,-350) T11(100,-350) T12(150,-350) T13(200,-350) T14(250,-350) T15(300,-350) T16(350,-350) T17(400,-350) U1(-400,-400) U2(-350,-400) U3(-300,-400) U4(-250,-400) U5(-200,-400) U6(-150,-400) U7(-100,-400) U8(-50,-400) U9(0,-400) U10(50,-400) U11(100,-400) U12(150,-400) U13(200,-400) U14(250,-400) U15(300,-400) U16(350,-400) U17(400,-400)
Top Overlay:
  lines w8: -452.69,406.69 -452.69,452.69 -406.69,452.69 ; -452.69,406.69 -452.69,-452.69 452.69,-452.69 452.69,452.69 -406.69,452.69 ; -452.69,406.69 -406.69,452.69
Top Solder:
  drawing of 241 lines, arcs and shapes, not listed

## PBGA256-17 [mil]
pads (256):
  rrect100% 27.56x27.56 smd: A1(-295.28,295.28) A2(-255.91,295.28) A3(-216.54,295.28) A4(-177.17,295.28) A5(-137.8,295.28) A6(-98.43,295.28) A7(-59.06,295.28) A8(-19.69,295.28) A9(19.69,295.28) A10(59.06,295.28) A11(98.43,295.28) A12(137.8,295.28) A13(177.17,295.28) A14(216.54,295.28) A15(255.91,295.28) A16(295.28,295.28) B1(-295.28,255.91) B2(-255.91,255.91) B3(-216.54,255.91) B4(-177.17,255.91) B5(-137.8,255.91) B6(-98.43,255.91) B7(-59.06,255.91) B8(-19.69,255.91) B9(19.69,255.91) B10(59.06,255.91) B11(98.43,255.91) B12(137.8,255.91) B13(177.17,255.91) B14(216.54,255.91) B15(255.91,255.91) B16(295.28,255.91) C1(-295.28,216.54) C2(-255.91,216.54) C3(-216.54,216.54) C4(-177.17,216.54) C5(-137.8,216.54) C6(-98.43,216.54) C7(-59.06,216.54) C8(-19.69,216.54) C9(19.69,216.54) C10(59.06,216.54) C11(98.43,216.54) C12(137.8,216.54) C13(177.17,216.54) C14(216.54,216.54) C15(255.91,216.54) C16(295.28,216.54) D1(-295.28,177.17) D2(-255.91,177.17) D3(-216.54,177.17) D4(-177.17,177.17) D5(-137.8,177.17) D6(-98.43,177.17) D7(-59.06,177.17) D8(-19.69,177.17) D9(19.69,177.17) D10(59.06,177.17) D11(98.43,177.17) D12(137.8,177.17) D13(177.17,177.17) D14(216.54,177.17) D15(255.91,177.17) D16(295.28,177.17) E1(-295.28,137.8) E2(-255.91,137.8) E3(-216.54,137.8) E4(-177.17,137.8) E5(-137.8,137.8) E6(-98.43,137.8) E7(-59.06,137.8) E8(-19.69,137.8) E9(19.69,137.8) E10(59.06,137.8) E11(98.43,137.8) E12(137.8,137.8) E13(177.17,137.8) E14(216.54,137.8) E15(255.91,137.8) E16(295.28,137.8) F1(-295.28,98.43) F2(-255.91,98.43) F3(-216.54,98.43) F4(-177.17,98.43) F5(-137.8,98.43) F6(-98.43,98.43) F7(-59.06,98.43) F8(-19.69,98.43) F9(19.69,98.43) F10(59.06,98.43) F11(98.43,98.43) F12(137.8,98.43) F13(177.17,98.43) F14(216.54,98.43) F15(255.91,98.43) F16(295.28,98.43) G1(-295.28,59.06) G2(-255.91,59.06) G3(-216.54,59.06) G4(-177.17,59.06) G5(-137.8,59.06) G6(-98.43,59.06) G7(-59.06,59.06) G8(-19.69,59.06) G9(19.69,59.06) G10(59.06,59.06) G11(98.43,59.06) G12(137.8,59.06) G13(177.17,59.06) G14(216.54,59.06) G15(255.91,59.06) G16(295.28,59.06) H1(-295.28,19.69) H2(-255.91,19.69) H3(-216.54,19.69) H4(-177.17,19.69) H5(-137.8,19.69) H6(-98.43,19.69) H7(-59.06,19.69) H8(-19.69,19.69) H9(19.69,19.69) H10(59.06,19.69) H11(98.43,19.69) H12(137.8,19.69) H13(177.17,19.69) H14(216.54,19.69) H15(255.91,19.69) H16(295.28,19.69) J1(-295.28,-19.69) J2(-255.91,-19.69) J3(-216.54,-19.69) J4(-177.17,-19.69) J5(-137.8,-19.69) J6(-98.43,-19.69) J7(-59.06,-19.69) J8(-19.69,-19.69) J9(19.69,-19.69) J10(59.06,-19.69) J11(98.43,-19.69) J12(137.8,-19.69) J13(177.17,-19.69) J14(216.54,-19.69) J15(255.91,-19.69) J16(295.28,-19.69) K1(-295.28,-59.06) K2(-255.91,-59.06) K3(-216.54,-59.06) K4(-177.17,-59.06) K5(-137.8,-59.06) K6(-98.43,-59.06) K7(-59.06,-59.06) K8(-19.69,-59.06) K9(19.69,-59.06) K10(59.06,-59.06) K11(98.43,-59.06) K12(137.8,-59.06) K13(177.17,-59.06) K14(216.54,-59.06) K15(255.91,-59.06) K16(295.28,-59.06) L1(-295.28,-98.43) L2(-255.91,-98.43) L3(-216.54,-98.43) L4(-177.17,-98.43) L5(-137.8,-98.43) L6(-98.43,-98.43) L7(-59.06,-98.43) L8(-19.69,-98.43) L9(19.69,-98.43) L10(59.06,-98.43) L11(98.43,-98.43) L12(137.8,-98.43) L13(177.17,-98.43) L14(216.54,-98.43) L15(255.91,-98.43) L16(295.28,-98.43) M1(-295.28,-137.8) M2(-255.91,-137.8) M3(-216.54,-137.8) M4(-177.17,-137.8) M5(-137.8,-137.8) M6(-98.43,-137.8) M7(-59.06,-137.8) M8(-19.69,-137.8) M9(19.69,-137.8) M10(59.06,-137.8) M11(98.43,-137.8) M12(137.8,-137.8) M13(177.17,-137.8) M14(216.54,-137.8) M15(255.91,-137.8) M16(295.28,-137.8) N1(-295.28,-177.17) N2(-255.91,-177.17) N3(-216.54,-177.17) N4(-177.17,-177.17) N5(-137.8,-177.17) N6(-98.43,-177.17) N7(-59.06,-177.17) N8(-19.69,-177.17) N9(19.69,-177.17) N10(59.06,-177.17) N11(98.43,-177.17) N12(137.8,-177.17) N13(177.17,-177.17) N14(216.54,-177.17) N15(255.91,-177.17) N16(295.28,-177.17) P1(-295.28,-216.54) P2(-255.91,-216.54) P3(-216.54,-216.54) P4(-177.17,-216.54) P5(-137.8,-216.54) P6(-98.43,-216.54) P7(-59.06,-216.54) P8(-19.69,-216.54) P9(19.69,-216.54) P10(59.06,-216.54) P11(98.43,-216.54) P12(137.8,-216.54) P13(177.17,-216.54) P14(216.54,-216.54) P15(255.91,-216.54) P16(295.28,-216.54) R1(-295.28,-255.91) R2(-255.91,-255.91) R3(-216.54,-255.91) R4(-177.17,-255.91) R5(-137.8,-255.91) R6(-98.43,-255.91) R7(-59.06,-255.91) R8(-19.69,-255.91) R9(19.69,-255.91) R10(59.06,-255.91) R11(98.43,-255.91) R12(137.8,-255.91) R13(177.17,-255.91) R14(216.54,-255.91) R15(255.91,-255.91) R16(295.28,-255.91) T1(-295.28,-295.28) T2(-255.91,-295.28) T3(-216.54,-295.28) T4(-177.17,-295.28) T5(-137.8,-295.28) T6(-98.43,-295.28) T7(-59.06,-295.28) T8(-19.69,-295.28) T9(19.69,-295.28) T10(59.06,-295.28) T11(98.43,-295.28) T12(137.8,-295.28) T13(177.17,-295.28) T14(216.54,-295.28) T15(255.91,-295.28) T16(295.28,-295.28)
Top Overlay:
  lines w8: -334.58,299.21 -334.58,334.58 -299.21,334.58 ; -334.58,299.21 -334.58,-334.58 334.58,-334.58 334.58,334.58 -299.21,334.58 ; -334.58,299.21 -299.21,334.58
Top Solder:
  drawing of 256 lines, arcs and shapes, not listed

## PBGA256-27 [mil]
pads (256):
  rrect100% 31.5x31.5 smd: A1(-475,475) A2(-425,475) A3(-375,475) A4(-325,475) A5(-275,475) A6(-225,475) A7(-175,475) A8(-125,475) A9(-75,475) A10(-25,475) A11(25,475) A12(75,475) A13(125,475) A14(175,475) A15(225,475) A16(275,475) A17(325,475) A18(375,475) A19(425,475) A20(475,475) B1(-475,425) B2(-425,425) B3(-375,425) B4(-325,425) B5(-275,425) B6(-225,425) B7(-175,425) B8(-125,425) B9(-75,425) B10(-25,425) B11(25,425) B12(75,425) B13(125,425) B14(175,425) B15(225,425) B16(275,425) B17(325,425) B18(375,425) B19(425,425) B20(475,425) C1(-475,375) C2(-425,375) C3(-375,375) C4(-325,375) C5(-275,375) C6(-225,375) C7(-175,375) C8(-125,375) C9(-75,375) C10(-25,375) C11(25,375) C12(75,375) C13(125,375) C14(175,375) C15(225,375) C16(275,375) C17(325,375) C18(375,375) C19(425,375) C20(475,375) D1(-475,325) D2(-425,325) D3(-375,325) D4(-325,325) D5(-275,325) D6(-225,325) D7(-175,325) D8(-125,325) D9(-75,325) D10(-25,325) D11(25,325) D12(75,325) D13(125,325) D14(175,325) D15(225,325) D16(275,325) D17(325,325) D18(375,325) D19(425,325) D20(475,325) E1(-475,275) E2(-425,275) E3(-375,275) E4(-325,275) E17(325,275) E18(375,275) E19(425,275) E20(475,275) F1(-475,225) F2(-425,225) F3(-375,225) F4(-325,225) F17(325,225) F18(375,225) F19(425,225) F20(475,225) G1(-475,175) G2(-425,175) G3(-375,175) G4(-325,175) G17(325,175) G18(375,175) G19(425,175) G20(475,175) H1(-475,125) H2(-425,125) H3(-375,125) H4(-325,125) H17(325,125) H18(375,125) H19(425,125) H20(475,125) J1(-475,75) J2(-425,75) J3(-375,75) J4(-325,75) J17(325,75) J18(375,75) J19(425,75) J20(475,75) K1(-475,25) K2(-425,25) K3(-375,25) K4(-325,25) K17(325,25) K18(375,25) K19(425,25) K20(475,25) L1(-475,-25) L2(-425,-25) L3(-375,-25) L4(-325,-25) L17(325,-25) L18(375,-25) L19(425,-25) L20(475,-25) M1(-475,-75) M2(-425,-75) M3(-375,-75) M4(-325,-75) M17(325,-75) M18(375,-75) M19(425,-75) M20(475,-75) N1(-475,-125) N2(-425,-125) N3(-375,-125) N4(-325,-125) N17(325,-125) N18(375,-125) N19(425,-125) N20(475,-125) P1(-475,-175) P2(-425,-175) P3(-375,-175) P4(-325,-175) P17(325,-175) P18(375,-175) P19(425,-175) P20(475,-175) R1(-475,-225) R2(-425,-225) R3(-375,-225) R4(-325,-225) R17(325,-225) R18(375,-225) R19(425,-225) R20(475,-225) T1(-475,-275) T2(-425,-275) T3(-375,-275) T4(-325,-275) T17(325,-275) T18(375,-275) T19(425,-275) T20(475,-275) U1(-475,-325) U2(-425,-325) U3(-375,-325) U4(-325,-325) U5(-275,-325) U6(-225,-325) U7(-175,-325) U8(-125,-325) U9(-75,-325) U10(-25,-325) U11(25,-325) U12(75,-325) U13(125,-325) U14(175,-325) U15(225,-325) U16(275,-325) U17(325,-325) U18(375,-325) U19(425,-325) U20(475,-325) V1(-475,-375) V2(-425,-375) V3(-375,-375) V4(-325,-375) V5(-275,-375) V6(-225,-375) V7(-175,-375) V8(-125,-375) V9(-75,-375) V10(-25,-375) V11(25,-375) V12(75,-375) V13(125,-375) V14(175,-375) V15(225,-375) V16(275,-375) V17(325,-375) V18(375,-375) V19(425,-375) V20(475,-375) W1(-475,-425) W2(-425,-425) W3(-375,-425) W4(-325,-425) W5(-275,-425) W6(-225,-425) W7(-175,-425) W8(-125,-425) W9(-75,-425) W10(-25,-425) W11(25,-425) W12(75,-425) W13(125,-425) W14(175,-425) W15(225,-425) W16(275,-425) W17(325,-425) W18(375,-425) W19(425,-425) W20(475,-425) Y1(-475,-475) Y2(-425,-475) Y3(-375,-475) Y4(-325,-475) Y5(-275,-475) Y6(-225,-475) Y7(-175,-475) Y8(-125,-475) Y9(-75,-475) Y10(-25,-475) Y11(25,-475) Y12(75,-475) Y13(125,-475) Y14(175,-475) Y15(225,-475) Y16(275,-475) Y17(325,-475) Y18(375,-475) Y19(425,-475) Y20(475,-475)
Top Overlay:
  lines w8: -531.43,485.43 -531.43,531.43 -485.43,531.43 ; -531.43,485.43 -531.43,-531.43 531.43,-531.43 531.43,531.43 -485.43,531.43 ; -531.43,485.43 -485.43,531.43
Top Solder:
  drawing of 256 lines, arcs and shapes, not listed

## PBGA304 [mil]
pads (304):
  rrect100% 31.5x31.5 smd: A1(-550,550) A2(-500,550) A3(-450,550) A4(-400,550) A5(-350,550) A6(-300,550) A7(-250,550) A8(-200,550) A9(-150,550) A10(-100,550) A11(-50,550) A12(0,550) A13(50,550) A14(100,550) A15(150,550) A16(200,550) A17(250,550) A18(300,550) A19(350,550) A20(400,550) A21(450,550) A22(500,550) A23(550,550) AA1(-550,-450) AA2(-500,-450) AA3(-450,-450) AA4(-400,-450) AA5(-350,-450) AA6(-300,-450) AA7(-250,-450) AA8(-200,-450) AA9(-150,-450) AA10(-100,-450) AA11(-50,-450) AA12(0,-450) AA13(50,-450) AA14(100,-450) AA15(150,-450) AA16(200,-450) AA17(250,-450) AA18(300,-450) AA19(350,-450) AA20(400,-450) AA21(450,-450) AA22(500,-450) AA23(550,-450) AB1(-550,-500) AB2(-500,-500) AB3(-450,-500) AB4(-400,-500) AB5(-350,-500) AB6(-300,-500) AB7(-250,-500) AB8(-200,-500) AB9(-150,-500) AB10(-100,-500) AB11(-50,-500) AB12(0,-500) AB13(50,-500) AB14(100,-500) AB15(150,-500) AB16(200,-500) AB17(250,-500) AB18(300,-500) AB19(350,-500) AB20(400,-500) AB21(450,-500) AB22(500,-500) AB23(550,-500) AC1(-550,-550) AC2(-500,-550) AC3(-450,-550) AC4(-400,-550) AC5(-350,-550) AC6(-300,-550) AC7(-250,-550) AC8(-200,-550) AC9(-150,-550) AC10(-100,-550) AC11(-50,-550) AC12(0,-550) AC13(50,-550) AC14(100,-550) AC15(150,-550) AC16(200,-550) AC17(250,-550) AC18(300,-550) AC19(350,-550) AC20(400,-550) AC21(450,-550) AC22(500,-550) AC23(550,-550) B1(-550,500) B2(-500,500) B3(-450,500) B4(-400,500) B5(-350,500) B6(-300,500) B7(-250,500) B8(-200,500) B9(-150,500) B10(-100,500) B11(-50,500) B12(0,500) B13(50,500) B14(100,500) B15(150,500) B16(200,500) B17(250,500) B18(300,500) B19(350,500) B20(400,500) B21(450,500) B22(500,500) B23(550,500) C1(-550,450) C2(-500,450) C3(-450,450) C4(-400,450) C5(-350,450) C6(-300,450) C7(-250,450) C8(-200,450) C9(-150,450) C10(-100,450) C11(-50,450) C12(0,450) C13(50,450) C14(100,450) C15(150,450) C16(200,450) C17(250,450) C18(300,450) C19(350,450) C20(400,450) C21(450,450) C22(500,450) C23(550,450) D1(-550,400) D2(-500,400) D3(-450,400) D4(-400,400) D5(-350,400) D6(-300,400) D7(-250,400) D8(-200,400) D9(-150,400) D10(-100,400) D11(-50,400) D12(0,400) D13(50,400) D14(100,400) D15(150,400) D16(200,400) D17(250,400) D18(300,400) D19(350,400) D20(400,400) D21(450,400) D22(500,400) D23(550,400) E1(-550,350) E2(-500,350) E3(-450,350) E4(-400,350) E20(400,350) E21(450,350) E22(500,350) E23(550,350) F1(-550,300) F2(-500,300) F3(-450,300) F4(-400,300) F20(400,300) F21(450,300) F22(500,300) F23(550,300) G1(-550,250) G2(-500,250) G3(-450,250) G4(-400,250) G20(400,250) G21(450,250) G22(500,250) G23(550,250) H1(-550,200) H2(-500,200) H3(-450,200) H4(-400,200) H20(400,200) H21(450,200) H22(500,200) H23(550,200) J1(-550,150) J2(-500,150) J3(-450,150) J4(-400,150) J20(400,150) J21(450,150) J22(500,150) J23(550,150) K1(-550,100) K2(-500,100) K3(-450,100) K4(-400,100) K20(400,100) K21(450,100) K22(500,100) K23(550,100) L1(-550,50) L2(-500,50) L3(-450,50) L4(-400,50) L20(400,50) L21(450,50) L22(500,50) L23(550,50) M1(-550,0) M2(-500,0) M3(-450,0) M4(-400,0) M20(400,0) M21(450,0) M22(500,0) M23(550,0) N1(-550,-50) N2(-500,-50) N3(-450,-50) N4(-400,-50) N20(400,-50) N21(450,-50) N22(500,-50) N23(550,-50) P1(-550,-100) P2(-500,-100) P3(-450,-100) P4(-400,-100) P20(400,-100) P21(450,-100) P22(500,-100) P23(550,-100) R1(-550,-150) R2(-500,-150) R3(-450,-150) R4(-400,-150) R20(400,-150) R21(450,-150) R22(500,-150) R23(550,-150) T1(-550,-200) T2(-500,-200) T3(-450,-200) T4(-400,-200) T20(400,-200) T21(450,-200) T22(500,-200) T23(550,-200) U1(-550,-250) U2(-500,-250) U3(-450,-250) U4(-400,-250) U20(400,-250) U21(450,-250) U22(500,-250) U23(550,-250) V1(-550,-300) V2(-500,-300) V3(-450,-300) V4(-400,-300) V20(400,-300) V21(450,-300) V22(500,-300) V23(550,-300) W1(-550,-350) W2(-500,-350) W3(-450,-350) W4(-400,-350) W20(400,-350) W21(450,-350) W22(500,-350) W23(550,-350) Y1(-550,-400) Y2(-500,-400) Y3(-450,-400) Y4(-400,-400) Y5(-350,-400) Y6(-300,-400) Y7(-250,-400) Y8(-200,-400) Y9(-150,-400) Y10(-100,-400) Y11(-50,-400) Y12(0,-400) Y13(50,-400) Y14(100,-400) Y15(150,-400) Y16(200,-400) Y17(250,-400) Y18(300,-400) Y19(350,-400) Y20(400,-400) Y21(450,-400) Y22(500,-400) Y23(550,-400)
Top Overlay:
  lines w8: -610.17,564.17 -610.17,610.17 -564.17,610.17 ; -610.17,564.17 -610.17,-610.17 610.17,-610.17 610.17,610.17 -564.17,610.17 ; -610.17,564.17 -564.17,610.17
Top Solder:
  drawing of 304 lines, arcs and shapes, not listed